# Altium schematic symbol library jlcpcb_2025_04_inductors_extended_0402.schlib: 1396 symbols (part 6 of 8) (continued)
## SDCL1005C4N7STDFM02
designator L?  Inductance: 4.7nH
Inductor, 4.7nH, SMD 0402; Manufacturer: Sunlord; Manufacturer Part Number: SDCL1005C4N7STDFM02; Package Size: 0402; JLCPCB Basic Part: No; JLCPCB Part Number: C370227; Supplier 1: LCSC; Category: Inductors; Supplier Part Number 1: C370227; RoHS: Yes; ComponentLink1Description: Datasheet; ComponentLink1URL: https://wmsc.lcsc.com/wmsc/upload/file/pdf/v2/lcsc/2110081530_Sunlord-SDCL1005C4N7STDFM02_C370227.pdf; ComponentLink2Description: JLCPCB Part URL; ComponentLink2URL: https://jlcpcb.com/partdetail/C370227; ComponentLink3Description: LCSC Part URL; ComponentLink3URL: https://lcsc.com/product-detail/Inductors-SMD_Sunlord-Sunlord-SDCL1005C4N7STDFM02_C370227.html
footprint IND-0402 (0402 (1005M) Inductor)
pins: 1, 2

## SDCL1005C5N1STDF
designator L?  Inductance: 5.1nH
Inductor, 5.1nH, 300mΩ, 300mA, SMD 0402; Manufacturer: Sunlord; Manufacturer Part Number: SDCL1005C5N1STDF; Self-Resonant Frequency: 100MHz; Q Factor: 8@100MHz; Package Size: 0402; JLCPCB Basic Part: No; JLCPCB Part Number: C33114; Supplier 1: LCSC; Category: Inductors; Supplier Part Number 1: C33114; Rated Current: 300mA; DC Resistance: 300mΩ; RoHS: Yes; ComponentLink1Description: Datasheet; ComponentLink1URL: https://wmsc.lcsc.com/wmsc/upload/file/pdf/v2/lcsc/2310301641_Sunlord-SDCL1005C5N1STDF_C33114.pdf; ComponentLink2Description: JLCPCB Part URL; ComponentLink2URL: https://jlcpcb.com/partdetail/C33114; ComponentLink3Description: LCSC Part URL; ComponentLink3URL: https://lcsc.com/product-detail/Inductors-SMD_Sunlord-Sunlord-SDCL1005C5N1STDF_C33114.html
footprint IND-0402 (0402 (1005M) Inductor)
pins: 1, 2

## SDCL1005C5N1STDFM01
designator L?  Inductance: 5.1nH
Inductor, 5.1nH, 300mΩ, 300mA, SMD 0402; Manufacturer: Sunlord; Manufacturer Part Number: SDCL1005C5N1STDFM01; Package Size: 0402; JLCPCB Basic Part: No; JLCPCB Part Number: C279821; Supplier 1: LCSC; Category: Inductors; Supplier Part Number 1: C279821; Rated Current: 300mA; DC Resistance: 300mΩ; RoHS: Yes; ComponentLink1Description: Datasheet; ComponentLink1URL: https://wmsc.lcsc.com/wmsc/upload/file/pdf/v2/lcsc/2110081330_Sunlord-SDCL1005C5N1STDFM01_C279821.pdf; ComponentLink2Description: JLCPCB Part URL; ComponentLink2URL: https://jlcpcb.com/partdetail/C279821; ComponentLink3Description: LCSC Part URL; ComponentLink3URL: https://lcsc.com/product-detail/Inductors-SMD_Sunlord-Sunlord-SDCL1005C5N1STDFM01_C279821.html
footprint IND-0402 (0402 (1005M) Inductor)
pins: 1, 2

## SDCL1005C5N6CTDFM01
designator L?  Inductance: 5.6nH
Inductor, 5.6nH, SMD 0402; Manufacturer: Sunlord; Manufacturer Part Number: SDCL1005C5N6CTDFM01; Package Size: 0402; JLCPCB Basic Part: No; JLCPCB Part Number: C370228; Supplier 1: LCSC; Category: Inductors; Supplier Part Number 1: C370228; RoHS: Yes; ComponentLink1Description: Datasheet; ComponentLink1URL: https://wmsc.lcsc.com/wmsc/upload/file/pdf/v2/lcsc/2110081530_Sunlord-SDCL1005C5N6CTDFM01_C370228.pdf; ComponentLink2Description: JLCPCB Part URL; ComponentLink2URL: https://jlcpcb.com/partdetail/C370228; ComponentLink3Description: LCSC Part URL; ComponentLink3URL: https://lcsc.com/product-detail/Inductors-SMD_Sunlord-Sunlord-SDCL1005C5N6CTDFM01_C370228.html
footprint IND-0402 (0402 (1005M) Inductor)
pins: 1, 2

## SDCL1005C5N6STDF
designator L?  Inductance: 5.6nH
Inductor, 5.6nH, 300mΩ, 300mA, SMD 0402; Manufacturer: Sunlord; Manufacturer Part Number: SDCL1005C5N6STDF; Self-Resonant Frequency: 100MHz; Q Factor: 8@100MHz; Package Size: 0402; JLCPCB Basic Part: No; JLCPCB Part Number: C279520; Supplier 1: LCSC; Category: Inductors; Supplier Part Number 1: C279520; Rated Current: 300mA; DC Resistance: 300mΩ; RoHS: Yes; ComponentLink1Description: Datasheet; ComponentLink1URL: https://wmsc.lcsc.com/wmsc/upload/file/pdf/v2/lcsc/2310301641_Sunlord-SDCL1005C5N6STDF_C279520.pdf; ComponentLink2Description: JLCPCB Part URL; ComponentLink2URL: https://jlcpcb.com/partdetail/C279520; ComponentLink3Description: LCSC Part URL; ComponentLink3URL: https://lcsc.com/product-detail/Inductors-SMD_Sunlord-Sunlord-SDCL1005C5N6STDF_C279520.html
footprint IND-0402 (0402 (1005M) Inductor)
pins: 1, 2

## SDCL1005C5N6STDFM01
designator L?  Inductance: 5.6nH
Inductor, 5.6nH, 300mΩ, 300mA, SMD 0402; Manufacturer: Sunlord; Manufacturer Part Number: SDCL1005C5N6STDFM01; Package Size: 0402; JLCPCB Basic Part: No; JLCPCB Part Number: C279773; Supplier 1: LCSC; Category: Inductors; Supplier Part Number 1: C279773; Rated Current: 300mA; DC Resistance: 300mΩ; RoHS: Yes; ComponentLink1Description: Datasheet; ComponentLink1URL: https://wmsc.lcsc.com/wmsc/upload/file/pdf/v2/lcsc/2110081330_Sunlord-SDCL1005C5N6STDFM01_C279773.pdf; ComponentLink2Description: JLCPCB Part URL; ComponentLink2URL: https://jlcpcb.com/partdetail/C279773; ComponentLink3Description: LCSC Part URL; ComponentLink3URL: https://lcsc.com/product-detail/Inductors-SMD_Sunlord-Sunlord-SDCL1005C5N6STDFM01_C279773.html
footprint IND-0402 (0402 (1005M) Inductor)
pins: 1, 2

## SDCL1005C6N2STDF
designator L?  Inductance: 6.2nH
Inductor, 6.2nH, 300mΩ, 300mA, SMD 0402; Manufacturer: Sunlord; Manufacturer Part Number: SDCL1005C6N2STDF; Self-Resonant Frequency: 100MHz; Q Factor: 8@100MHz; Package Size: 0402; JLCPCB Basic Part: No; JLCPCB Part Number: C279519; Supplier 1: LCSC; Category: Inductors; Supplier Part Number 1: C279519; Rated Current: 300mA; DC Resistance: 300mΩ; RoHS: Yes; ComponentLink1Description: Datasheet; ComponentLink1URL: https://wmsc.lcsc.com/wmsc/upload/file/pdf/v2/lcsc/2310301641_Sunlord-SDCL1005C6N2STDF_C279519.pdf; ComponentLink2Description: JLCPCB Part URL; ComponentLink2URL: https://jlcpcb.com/partdetail/C279519; ComponentLink3Description: LCSC Part URL; ComponentLink3URL: https://lcsc.com/product-detail/Inductors-SMD_Sunlord-Sunlord-SDCL1005C6N2STDF_C279519.html
footprint IND-0402 (0402 (1005M) Inductor)
pins: 1, 2

## SDCL1005C6N2STDFM01
designator L?  Inductance: 6.2nH
Inductor, 6.2nH, 300mΩ, 300mA, SMD 0402; Manufacturer: Sunlord; Manufacturer Part Number: SDCL1005C6N2STDFM01; Package Size: 0402; JLCPCB Basic Part: No; JLCPCB Part Number: C370229; Supplier 1: LCSC; Category: Inductors; Supplier Part Number 1: C370229; Rated Current: 300mA; DC Resistance: 300mΩ; RoHS: Yes; ComponentLink1Description: Datasheet; ComponentLink1URL: https://wmsc.lcsc.com/wmsc/upload/file/pdf/v2/lcsc/2110081530_Sunlord-SDCL1005C6N2STDFM01_C370229.pdf; ComponentLink2Description: JLCPCB Part URL; ComponentLink2URL: https://jlcpcb.com/partdetail/C370229; ComponentLink3Description: LCSC Part URL; ComponentLink3URL: https://lcsc.com/product-detail/Inductors-SMD_Sunlord-Sunlord-SDCL1005C6N2STDFM01_C370229.html
footprint IND-0402 (0402 (1005M) Inductor)
pins: 1, 2

## SDCL1005C6N8HTDF
designator L?  Inductance: 6.8nH
Inductor, 6.8nH, ±3%, 300mΩ, 300mA, SMD 0402; Manufacturer: Sunlord; Manufacturer Part Number: SDCL1005C6N8HTDF; Self-Resonant Frequency: 100MHz; Q Factor: 8@100MHz; Package Size: 0402; JLCPCB Basic Part: No; JLCPCB Part Number: C370230; Supplier 1: LCSC; Category: Inductors; Supplier Part Number 1: C370230; Tolerance: ±3%; Rated Current: 300mA; DC Resistance: 300mΩ; RoHS: Yes; ComponentLink1Description: Datasheet; ComponentLink1URL: https://wmsc.lcsc.com/wmsc/upload/file/pdf/v2/lcsc/2310301641_Sunlord-SDCL1005C6N8HTDF_C370230.pdf; ComponentLink2Description: JLCPCB Part URL; ComponentLink2URL: https://jlcpcb.com/partdetail/C370230; ComponentLink3Description: LCSC Part URL; ComponentLink3URL: https://lcsc.com/product-detail/Inductors-SMD_Sunlord-Sunlord-SDCL1005C6N8HTDF_C370230.html
footprint IND-0402 (0402 (1005M) Inductor)
pins: 1, 2

## SDCL1005C6N8JTDF
designator L?  Inductance: 6.8nH
Inductor, 6.8nH, ±5%, 300mΩ, 300mA, SMD 0402; Manufacturer: Sunlord; Manufacturer Part Number: SDCL1005C6N8JTDF; Q Factor: 8@100MHz; Package Size: 0402; JLCPCB Basic Part: No; JLCPCB Part Number: C32041; Supplier 1: LCSC; Category: Inductors; Supplier Part Number 1: C32041; Tolerance: ±5%; Rated Current: 300mA; DC Resistance: 300mΩ; RoHS: Yes; ComponentLink1Description: Datasheet; ComponentLink1URL: https://wmsc.lcsc.com/wmsc/upload/file/pdf/v2/lcsc/2310301641_Sunlord-SDCL1005C6N8JTDF_C32041.pdf; ComponentLink2Description: JLCPCB Part URL; ComponentLink2URL: https://jlcpcb.com/partdetail/C32041; ComponentLink3Description: LCSC Part URL; ComponentLink3URL: https://lcsc.com/product-detail/Inductors-SMD_Sunlord-Sunlord-SDCL1005C6N8JTDF_C32041.html
footprint IND-0402 (0402 (1005M) Inductor)
pins: 1, 2

## SDCL1005C6N8JTDFM01
designator L?  Inductance: 6.8nH
Inductor, 6.8nH, ±5%, 300mΩ, 300mA, SMD 0402; Manufacturer: Sunlord; Manufacturer Part Number: SDCL1005C6N8JTDFM01; Package Size: 0402; JLCPCB Basic Part: No; JLCPCB Part Number: C279543; Supplier 1: LCSC; Category: Inductors; Supplier Part Number 1: C279543; Tolerance: ±5%; Rated Current: 300mA; DC Resistance: 300mΩ; RoHS: Yes; ComponentLink1Description: Datasheet; ComponentLink1URL: https://wmsc.lcsc.com/wmsc/upload/file/pdf/v2/lcsc/2110081330_Sunlord-SDCL1005C6N8JTDFM01_C279543.pdf; ComponentLink2Description: JLCPCB Part URL; ComponentLink2URL: https://jlcpcb.com/partdetail/C279543; ComponentLink3Description: LCSC Part URL; ComponentLink3URL: https://lcsc.com/product-detail/Inductors-SMD_Sunlord-Sunlord-SDCL1005C6N8JTDFM01_C279543.html
footprint IND-0402 (0402 (1005M) Inductor)
pins: 1, 2

## SDCL1005C6N8JTDFM02
designator L?  Inductance: 6.8nH
Inductor, 6.8nH, ±5%, SMD 0402; Manufacturer: Sunlord; Manufacturer Part Number: SDCL1005C6N8JTDFM02; Package Size: 0402; JLCPCB Basic Part: No; JLCPCB Part Number: C370231; Supplier 1: LCSC; Category: Inductors; Supplier Part Number 1: C370231; Tolerance: ±5%; RoHS: Yes; ComponentLink1Description: Datasheet; ComponentLink1URL: https://wmsc.lcsc.com/wmsc/upload/file/pdf/v2/lcsc/2110081530_Sunlord-SDCL1005C6N8JTDFM02_C370231.pdf; ComponentLink2Description: JLCPCB Part URL; ComponentLink2URL: https://jlcpcb.com/partdetail/C370231; ComponentLink3Description: LCSC Part URL; ComponentLink3URL: https://lcsc.com/product-detail/Inductors-SMD_Sunlord-Sunlord-SDCL1005C6N8JTDFM02_C370231.html
footprint IND-0402 (0402 (1005M) Inductor)
pins: 1, 2

## SDCL1005C7N5JTDF
designator L?  Inductance: 7.5nH
Inductor, 7.5nH, ±5%, 400mΩ, 300mA, SMD 0402; Manufacturer: Sunlord; Manufacturer Part Number: SDCL1005C7N5JTDF; Self-Resonant Frequency: 100MHz; Q Factor: 8@100MHz; Package Size: 0402; JLCPCB Basic Part: No; JLCPCB Part Number: C279523; Supplier 1: LCSC; Category: Inductors; Supplier Part Number 1: C279523; Tolerance: ±5%; Rated Current: 300mA; DC Resistance: 400mΩ; RoHS: Yes; ComponentLink1Description: Datasheet; ComponentLink1URL: https://wmsc.lcsc.com/wmsc/upload/file/pdf/v2/lcsc/2310301641_Sunlord-SDCL1005C7N5JTDF_C279523.pdf; ComponentLink2Description: JLCPCB Part URL; ComponentLink2URL: https://jlcpcb.com/partdetail/C279523; ComponentLink3Description: LCSC Part URL; ComponentLink3URL: https://lcsc.com/product-detail/Inductors-SMD_Sunlord-Sunlord-SDCL1005C7N5JTDF_C279523.html
footprint IND-0402 (0402 (1005M) Inductor)
pins: 1, 2

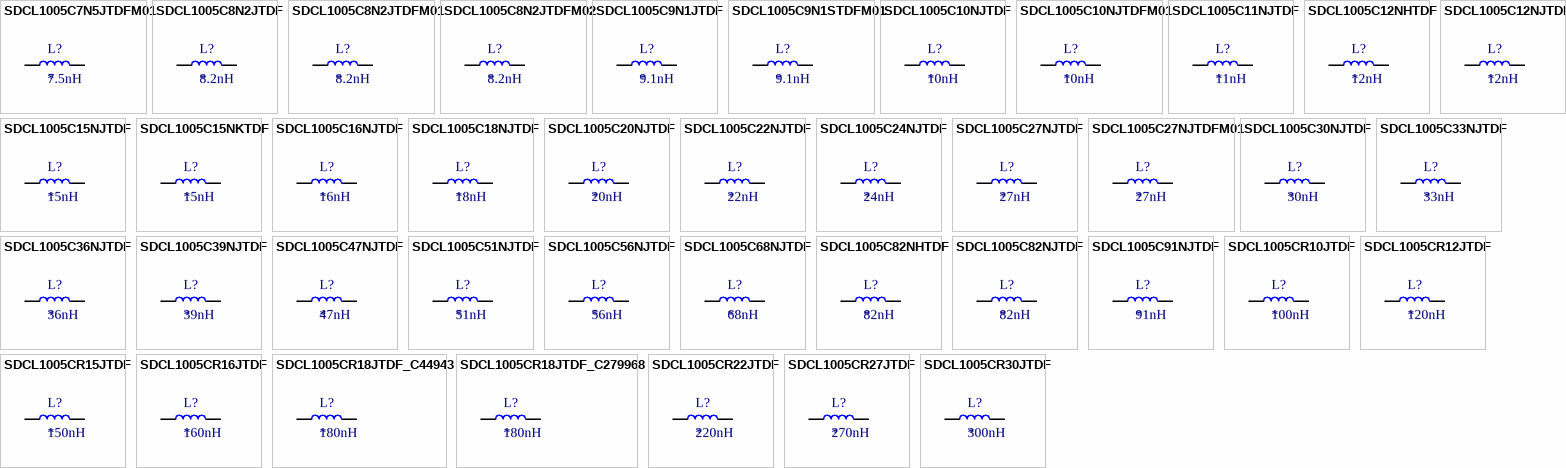
[diagram p28: symbols SDCL1005C7N5JTDFM01 to SDCL1005CR30JTDF]

## SDCL1005C7N5JTDFM01
designator L?  Inductance: 7.5nH
Inductor, 7.5nH, ±5%, 400mΩ, 300mA, SMD 0402; Manufacturer: Sunlord; Manufacturer Part Number: SDCL1005C7N5JTDFM01; Package Size: 0402; JLCPCB Basic Part: No; JLCPCB Part Number: C74295; Supplier 1: LCSC; Category: Inductors; Supplier Part Number 1: C74295; Tolerance: ±5%; Rated Current: 300mA; DC Resistance: 400mΩ; RoHS: Yes; ComponentLink1Description: Datasheet; ComponentLink1URL: https://wmsc.lcsc.com/wmsc/upload/file/pdf/v2/lcsc/2110081230_Sunlord-SDCL1005C7N5JTDFM01_C74295.pdf; ComponentLink2Description: JLCPCB Part URL; ComponentLink2URL: https://jlcpcb.com/partdetail/C74295; ComponentLink3Description: LCSC Part URL; ComponentLink3URL: https://lcsc.com/product-detail/Inductors-SMD_Sunlord-Sunlord-SDCL1005C7N5JTDFM01_C74295.html
footprint IND-0402 (0402 (1005M) Inductor)
pins: 1, 2

## SDCL1005C8N2JTDF
designator L?  Inductance: 8.2nH
Inductor, 8.2nH, ±5%, 400mΩ, 300mA, SMD 0402; Manufacturer: Sunlord; Manufacturer Part Number: SDCL1005C8N2JTDF; Self-Resonant Frequency: 100MHz; Q Factor: 8@100MHz; Package Size: 0402; JLCPCB Basic Part: No; JLCPCB Part Number: C16208; Supplier 1: LCSC; Category: Inductors; Supplier Part Number 1: C16208; Tolerance: ±5%; Rated Current: 300mA; DC Resistance: 400mΩ; RoHS: Yes; ComponentLink1Description: Datasheet; ComponentLink1URL: https://wmsc.lcsc.com/wmsc/upload/file/pdf/v2/lcsc/2310301641_Sunlord-SDCL1005C8N2JTDF_C16208.pdf; ComponentLink2Description: JLCPCB Part URL; ComponentLink2URL: https://jlcpcb.com/partdetail/C16208; ComponentLink3Description: LCSC Part URL; ComponentLink3URL: https://lcsc.com/product-detail/Inductors-SMD_Sunlord-Sunlord-SDCL1005C8N2JTDF_C16208.html
footprint IND-0402 (0402 (1005M) Inductor)
pins: 1, 2

## SDCL1005C8N2JTDFM01
designator L?  Inductance: 8.2nH
Inductor, 8.2nH, ±5%, 400mΩ, 300mA, SMD 0402; Manufacturer: Sunlord; Manufacturer Part Number: SDCL1005C8N2JTDFM01; Package Size: 0402; JLCPCB Basic Part: No; JLCPCB Part Number: C370232; Supplier 1: LCSC; Category: Inductors; Supplier Part Number 1: C370232; Tolerance: ±5%; Rated Current: 300mA; DC Resistance: 400mΩ; RoHS: Yes; ComponentLink1Description: Datasheet; ComponentLink1URL: https://wmsc.lcsc.com/wmsc/upload/file/pdf/v2/lcsc/2110081530_Sunlord-SDCL1005C8N2JTDFM01_C370232.pdf; ComponentLink2Description: JLCPCB Part URL; ComponentLink2URL: https://jlcpcb.com/partdetail/C370232; ComponentLink3Description: LCSC Part URL; ComponentLink3URL: https://lcsc.com/product-detail/Inductors-SMD_Sunlord-Sunlord-SDCL1005C8N2JTDFM01_C370232.html
footprint IND-0402 (0402 (1005M) Inductor)
pins: 1, 2

## SDCL1005C8N2JTDFM02
designator L?  Inductance: 8.2nH
Inductor, 8.2nH, ±5%, SMD 0402; Manufacturer: Sunlord; Manufacturer Part Number: SDCL1005C8N2JTDFM02; Package Size: 0402; JLCPCB Basic Part: No; JLCPCB Part Number: C370233; Supplier 1: LCSC; Category: Inductors; Supplier Part Number 1: C370233; Tolerance: ±5%; RoHS: Yes; ComponentLink1Description: Datasheet; ComponentLink1URL: https://wmsc.lcsc.com/wmsc/upload/file/pdf/v2/lcsc/2110081530_Sunlord-SDCL1005C8N2JTDFM02_C370233.pdf; ComponentLink2Description: JLCPCB Part URL; ComponentLink2URL: https://jlcpcb.com/partdetail/C370233; ComponentLink3Description: LCSC Part URL; ComponentLink3URL: https://lcsc.com/product-detail/Inductors-SMD_Sunlord-Sunlord-SDCL1005C8N2JTDFM02_C370233.html
footprint IND-0402 (0402 (1005M) Inductor)
pins: 1, 2

## SDCL1005C9N1JTDF
designator L?  Inductance: 9.1nH
Inductor, 9.1nH, ±5%, 400mΩ, 300mA, SMD 0402; Manufacturer: Sunlord; Manufacturer Part Number: SDCL1005C9N1JTDF; Q Factor: 8@100MHz; Package Size: 0402; JLCPCB Basic Part: No; JLCPCB Part Number: C279975; Supplier 1: LCSC; Category: Inductors; Supplier Part Number 1: C279975; Tolerance: ±5%; Rated Current: 300mA; DC Resistance: 400mΩ; RoHS: Yes; ComponentLink1Description: Datasheet; ComponentLink1URL: https://wmsc.lcsc.com/wmsc/upload/file/pdf/v2/lcsc/2310301641_Sunlord-SDCL1005C9N1JTDF_C279975.pdf; ComponentLink2Description: JLCPCB Part URL; ComponentLink2URL: https://jlcpcb.com/partdetail/C279975; ComponentLink3Description: LCSC Part URL; ComponentLink3URL: https://lcsc.com/product-detail/Inductors-SMD_Sunlord-Sunlord-SDCL1005C9N1JTDF_C279975.html
footprint IND-0402 (0402 (1005M) Inductor)
pins: 1, 2

## SDCL1005C9N1STDFM01
designator L?  Inductance: 9.1nH
Inductor, 9.1nH, 400mΩ, 300mA, SMD 0402; Manufacturer: Sunlord; Manufacturer Part Number: SDCL1005C9N1STDFM01; Package Size: 0402; JLCPCB Basic Part: No; JLCPCB Part Number: C74297; Supplier 1: LCSC; Category: Inductors; Supplier Part Number 1: C74297; Rated Current: 300mA; DC Resistance: 400mΩ; RoHS: Yes; ComponentLink1Description: Datasheet; ComponentLink1URL: https://wmsc.lcsc.com/wmsc/upload/file/pdf/v2/lcsc/2110081230_Sunlord-SDCL1005C9N1STDFM01_C74297.pdf; ComponentLink2Description: JLCPCB Part URL; ComponentLink2URL: https://jlcpcb.com/partdetail/C74297; ComponentLink3Description: LCSC Part URL; ComponentLink3URL: https://lcsc.com/product-detail/Inductors-SMD_Sunlord-Sunlord-SDCL1005C9N1STDFM01_C74297.html
footprint IND-0402 (0402 (1005M) Inductor)
pins: 1, 2

## SDCL1005C10NJTDF
designator L?  Inductance: 10nH
Inductor, 10nH, ±5%, 400mΩ, 300mA, SMD 0402; Manufacturer: Sunlord; Manufacturer Part Number: SDCL1005C10NJTDF; Self-Resonant Frequency: 100MHz; Q Factor: 8@100MHz; Package Size: 0402; JLCPCB Basic Part: No; JLCPCB Part Number: C27147; Supplier 1: LCSC; Category: Inductors; Supplier Part Number 1: C27147; Tolerance: ±5%; Rated Current: 300mA; DC Resistance: 400mΩ; RoHS: Yes; ComponentLink1Description: Datasheet; ComponentLink1URL: https://wmsc.lcsc.com/wmsc/upload/file/pdf/v2/lcsc/2310301641_Sunlord-SDCL1005C10NJTDF_C27147.pdf; ComponentLink2Description: JLCPCB Part URL; ComponentLink2URL: https://jlcpcb.com/partdetail/C27147; ComponentLink3Description: LCSC Part URL; ComponentLink3URL: https://lcsc.com/product-detail/Inductors-SMD_Sunlord-Sunlord-SDCL1005C10NJTDF_C27147.html
footprint IND-0402 (0402 (1005M) Inductor)
pins: 1, 2

## SDCL1005C10NJTDFM01
designator L?  Inductance: 10nH
Inductor, 10nH, ±5%, 400mΩ, 300mA, SMD 0402; Manufacturer: Sunlord; Manufacturer Part Number: SDCL1005C10NJTDFM01; Package Size: 0402; JLCPCB Basic Part: No; JLCPCB Part Number: C279838; Supplier 1: LCSC; Category: Inductors; Supplier Part Number 1: C279838; Tolerance: ±5%; Rated Current: 300mA; DC Resistance: 400mΩ; RoHS: Yes; ComponentLink1Description: Datasheet; ComponentLink1URL: https://wmsc.lcsc.com/wmsc/upload/file/pdf/v2/lcsc/2110081330_Sunlord-SDCL1005C10NJTDFM01_C279838.pdf; ComponentLink2Description: JLCPCB Part URL; ComponentLink2URL: https://jlcpcb.com/partdetail/C279838; ComponentLink3Description: LCSC Part URL; ComponentLink3URL: https://lcsc.com/product-detail/Inductors-SMD_Sunlord-Sunlord-SDCL1005C10NJTDFM01_C279838.html
footprint IND-0402 (0402 (1005M) Inductor)
pins: 1, 2

## SDCL1005C11NJTDF
designator L?  Inductance: 11nH
Inductor, 11nH, ±5%, SMD 0402; Manufacturer: Sunlord; Manufacturer Part Number: SDCL1005C11NJTDF; Package Size: 0402; JLCPCB Basic Part: No; JLCPCB Part Number: C74302; Supplier 1: LCSC; Category: Inductors; Supplier Part Number 1: C74302; Tolerance: ±5%; RoHS: Yes; ComponentLink1Description: Datasheet; ComponentLink1URL: https://wmsc.lcsc.com/wmsc/upload/file/pdf/v2/lcsc/2310301641_Sunlord-SDCL1005C11NJTDF_C74302.pdf; ComponentLink2Description: JLCPCB Part URL; ComponentLink2URL: https://jlcpcb.com/partdetail/C74302; ComponentLink3Description: LCSC Part URL; ComponentLink3URL: https://lcsc.com/product-detail/Inductors-SMD_Sunlord-Sunlord-SDCL1005C11NJTDF_C74302.html
footprint IND-0402 (0402 (1005M) Inductor)
pins: 1, 2

## SDCL1005C12NHTDF
designator L?  Inductance: 12nH
Inductor, 12nH, ±3%, 500mΩ, 300mA, SMD 0402; Manufacturer: Sunlord; Manufacturer Part Number: SDCL1005C12NHTDF; Self-Resonant Frequency: 2.7GHz; Q Factor: 8@100MHz; Package Size: 0402; JLCPCB Basic Part: No; JLCPCB Part Number: C2984259; Supplier 1: LCSC; Category: Inductors; Supplier Part Number 1: C2984259; Tolerance: ±3%; Rated Current: 300mA; DC Resistance: 500mΩ; RoHS: Yes; ComponentLink1Description: Datasheet; ComponentLink1URL: https://wmsc.lcsc.com/wmsc/upload/file/pdf/v2/lcsc/2203231830_Sunlord-SDCL1005C12NHTDF_C2984259.pdf; ComponentLink2Description: JLCPCB Part URL; ComponentLink2URL: https://jlcpcb.com/partdetail/C2984259; ComponentLink3Description: LCSC Part URL; ComponentLink3URL: https://lcsc.com/product-detail/Inductors-SMD_Sunlord-Sunlord-SDCL1005C12NHTDF_C2984259.html
footprint IND-0402 (0402 (1005M) Inductor)
pins: 1, 2

## SDCL1005C12NJTDF
designator L?  Inductance: 12nH
Inductor, 12nH, ±5%, 500mΩ, 300mA, SMD 0402; Manufacturer: Sunlord; Manufacturer Part Number: SDCL1005C12NJTDF; Self-Resonant Frequency: 100MHz; Q Factor: 8@100MHz; Package Size: 0402; JLCPCB Basic Part: No; JLCPCB Part Number: C24563; Supplier 1: LCSC; Category: Inductors; Supplier Part Number 1: C24563; Tolerance: ±5%; Rated Current: 300mA; DC Resistance: 500mΩ; RoHS: Yes; ComponentLink1Description: Datasheet; ComponentLink1URL: https://wmsc.lcsc.com/wmsc/upload/file/pdf/v2/lcsc/2310301641_Sunlord-SDCL1005C12NJTDF_C24563.pdf; ComponentLink2Description: JLCPCB Part URL; ComponentLink2URL: https://jlcpcb.com/partdetail/C24563; ComponentLink3Description: LCSC Part URL; ComponentLink3URL: https://lcsc.com/product-detail/Inductors-SMD_Sunlord-Sunlord-SDCL1005C12NJTDF_C24563.html
footprint IND-0402 (0402 (1005M) Inductor)
pins: 1, 2

## SDCL1005C15NJTDF
designator L?  Inductance: 15nH
Inductor, 15nH, ±5%, 500mΩ, 300mA, SMD 0402; Manufacturer: Sunlord; Manufacturer Part Number: SDCL1005C15NJTDF; Self-Resonant Frequency: 100MHz; Q Factor: 8@100MHz; Package Size: 0402; JLCPCB Basic Part: No; JLCPCB Part Number: C27143; Supplier 1: LCSC; Category: Inductors; Supplier Part Number 1: C27143; Tolerance: ±5%; Rated Current: 300mA; DC Resistance: 500mΩ; RoHS: Yes; ComponentLink1Description: Datasheet; ComponentLink1URL: https://wmsc.lcsc.com/wmsc/upload/file/pdf/v2/lcsc/2310301641_Sunlord-SDCL1005C15NJTDF_C27143.pdf; ComponentLink2Description: JLCPCB Part URL; ComponentLink2URL: https://jlcpcb.com/partdetail/C27143; ComponentLink3Description: LCSC Part URL; ComponentLink3URL: https://lcsc.com/product-detail/Inductors-SMD_Sunlord-Sunlord-SDCL1005C15NJTDF_C27143.html
footprint IND-0402 (0402 (1005M) Inductor)
pins: 1, 2

## SDCL1005C15NKTDF
designator L?  Inductance: 15nH
Inductor, 15nH, ±10%, 500mΩ, 300mA, SMD 0402; Manufacturer: Sunlord; Manufacturer Part Number: SDCL1005C15NKTDF; Package Size: 0402; JLCPCB Basic Part: No; JLCPCB Part Number: C370189; Supplier 1: LCSC; Category: Inductors; Supplier Part Number 1: C370189; Tolerance: ±10%; Rated Current: 300mA; DC Resistance: 500mΩ; RoHS: Yes; ComponentLink1Description: Datasheet; ComponentLink1URL: https://wmsc.lcsc.com/wmsc/upload/file/pdf/v2/lcsc/2310301641_Sunlord-SDCL1005C15NKTDF_C370189.pdf; ComponentLink2Description: JLCPCB Part URL; ComponentLink2URL: https://jlcpcb.com/partdetail/C370189; ComponentLink3Description: LCSC Part URL; ComponentLink3URL: https://lcsc.com/product-detail/Inductors-SMD_Sunlord-Sunlord-SDCL1005C15NKTDF_C370189.html
footprint IND-0402 (0402 (1005M) Inductor)
pins: 1, 2

## SDCL1005C16NJTDF
designator L?  Inductance: 16nH
Inductor, 16nH, ±5%, SMD 0402; Manufacturer: Sunlord; Manufacturer Part Number: SDCL1005C16NJTDF; Package Size: 0402; JLCPCB Basic Part: No; JLCPCB Part Number: C370190; Supplier 1: LCSC; Category: Inductors; Supplier Part Number 1: C370190; Tolerance: ±5%; RoHS: Yes; ComponentLink1Description: Datasheet; ComponentLink1URL: https://wmsc.lcsc.com/wmsc/upload/file/pdf/v2/lcsc/2312131129_Sunlord-SDCL1005C16NJTDF_C370190.pdf; ComponentLink2Description: JLCPCB Part URL; ComponentLink2URL: https://jlcpcb.com/partdetail/C370190; ComponentLink3Description: LCSC Part URL; ComponentLink3URL: https://lcsc.com/product-detail/Inductors-SMD_Sunlord-Sunlord-SDCL1005C16NJTDF_C370190.html
footprint IND-0402 (0402 (1005M) Inductor)
pins: 1, 2

## SDCL1005C18NJTDF
designator L?  Inductance: 18nH
Inductor, 18nH, ±5%, 600mΩ, 300mA, SMD 0402; Manufacturer: Sunlord; Manufacturer Part Number: SDCL1005C18NJTDF; Self-Resonant Frequency: 100MHz; Q Factor: 8@100MHz; Package Size: 0402; JLCPCB Basic Part: No; JLCPCB Part Number: C24562; Supplier 1: LCSC; Category: Inductors; Supplier Part Number 1: C24562; Tolerance: ±5%; Rated Current: 300mA; DC Resistance: 600mΩ; RoHS: Yes; ComponentLink1Description: Datasheet; ComponentLink1URL: https://wmsc.lcsc.com/wmsc/upload/file/pdf/v2/lcsc/2310301641_Sunlord-SDCL1005C18NJTDF_C24562.pdf; ComponentLink2Description: JLCPCB Part URL; ComponentLink2URL: https://jlcpcb.com/partdetail/C24562; ComponentLink3Description: LCSC Part URL; ComponentLink3URL: https://lcsc.com/product-detail/Inductors-SMD_Sunlord-Sunlord-SDCL1005C18NJTDF_C24562.html
footprint IND-0402 (0402 (1005M) Inductor)
pins: 1, 2

## SDCL1005C20NJTDF
designator L?  Inductance: 20nH
Inductor, 20nH, ±5%, 600mΩ, 300mA, SMD 0402; Manufacturer: Sunlord; Manufacturer Part Number: SDCL1005C20NJTDF; Self-Resonant Frequency: 2GHz; Q Factor: 8@100MHz; Package Size: 0402; JLCPCB Basic Part: No; JLCPCB Part Number: C96730; Supplier 1: LCSC; Category: Inductors; Supplier Part Number 1: C96730; Tolerance: ±5%; Rated Current: 300mA; DC Resistance: 600mΩ; RoHS: Yes; ComponentLink1Description: Datasheet; ComponentLink1URL: https://wmsc.lcsc.com/wmsc/upload/file/pdf/v2/lcsc/2310301641_Sunlord-SDCL1005C20NJTDF_C96730.pdf; ComponentLink2Description: JLCPCB Part URL; ComponentLink2URL: https://jlcpcb.com/partdetail/C96730; ComponentLink3Description: LCSC Part URL; ComponentLink3URL: https://lcsc.com/product-detail/Inductors-SMD_Sunlord-Sunlord-SDCL1005C20NJTDF_C96730.html
footprint IND-0402 (0402 (1005M) Inductor)
pins: 1, 2

## SDCL1005C22NJTDF
designator L?  Inductance: 22nH
Inductor, 22nH, ±5%, 600mΩ, 300mA, SMD 0402; Manufacturer: Sunlord; Manufacturer Part Number: SDCL1005C22NJTDF; Self-Resonant Frequency: 100MHz; Q Factor: 8@100MHz; Package Size: 0402; JLCPCB Basic Part: No; JLCPCB Part Number: C15178; Supplier 1: LCSC; Category: Inductors; Supplier Part Number 1: C15178; Tolerance: ±5%; Rated Current: 300mA; DC Resistance: 600mΩ; RoHS: Yes; ComponentLink1Description: Datasheet; ComponentLink1URL: https://wmsc.lcsc.com/wmsc/upload/file/pdf/v2/lcsc/2310301641_Sunlord-SDCL1005C22NJTDF_C15178.pdf; ComponentLink2Description: JLCPCB Part URL; ComponentLink2URL: https://jlcpcb.com/partdetail/C15178; ComponentLink3Description: LCSC Part URL; ComponentLink3URL: https://lcsc.com/product-detail/Inductors-SMD_Sunlord-Sunlord-SDCL1005C22NJTDF_C15178.html
footprint IND-0402 (0402 (1005M) Inductor)
pins: 1, 2

## SDCL1005C24NJTDF
designator L?  Inductance: 24nH
Inductor, 24nH, ±5%, SMD 0402; Manufacturer: Sunlord; Manufacturer Part Number: SDCL1005C24NJTDF; Package Size: 0402; JLCPCB Basic Part: No; JLCPCB Part Number: C74301; Supplier 1: LCSC; Category: Inductors; Supplier Part Number 1: C74301; Tolerance: ±5%; RoHS: Yes; ComponentLink1Description: Datasheet; ComponentLink1URL: https://wmsc.lcsc.com/wmsc/upload/file/pdf/v2/lcsc/2310301641_Sunlord-SDCL1005C24NJTDF_C74301.pdf; ComponentLink2Description: JLCPCB Part URL; ComponentLink2URL: https://jlcpcb.com/partdetail/C74301; ComponentLink3Description: LCSC Part URL; ComponentLink3URL: https://lcsc.com/product-detail/Inductors-SMD_Sunlord-Sunlord-SDCL1005C24NJTDF_C74301.html
footprint IND-0402 (0402 (1005M) Inductor)
pins: 1, 2

## SDCL1005C27NJTDF
designator L?  Inductance: 27nH
Inductor, 27nH, ±5%, 700mΩ, 300mA, SMD 0402; Manufacturer: Sunlord; Manufacturer Part Number: SDCL1005C27NJTDF; Self-Resonant Frequency: 100MHz; Q Factor: 8@100MHz; Package Size: 0402; JLCPCB Basic Part: No; JLCPCB Part Number: C18830; Supplier 1: LCSC; Category: Inductors; Supplier Part Number 1: C18830; Tolerance: ±5%; Rated Current: 300mA; DC Resistance: 700mΩ; RoHS: Yes; ComponentLink1Description: Datasheet; ComponentLink1URL: https://wmsc.lcsc.com/wmsc/upload/file/pdf/v2/lcsc/2310301641_Sunlord-SDCL1005C27NJTDF_C18830.pdf; ComponentLink2Description: JLCPCB Part URL; ComponentLink2URL: https://jlcpcb.com/partdetail/C18830; ComponentLink3Description: LCSC Part URL; ComponentLink3URL: https://lcsc.com/product-detail/Inductors-SMD_Sunlord-Sunlord-SDCL1005C27NJTDF_C18830.html
footprint IND-0402 (0402 (1005M) Inductor)
pins: 1, 2

## SDCL1005C27NJTDFM01
designator L?  Inductance: 27nH
Inductor, 27nH, ±5%, 700mΩ, 300mA, SMD 0402; Manufacturer: Sunlord; Manufacturer Part Number: SDCL1005C27NJTDFM01; Package Size: 0402; JLCPCB Basic Part: No; JLCPCB Part Number: C279788; Supplier 1: LCSC; Category: Inductors; Supplier Part Number 1: C279788; Tolerance: ±5%; Rated Current: 300mA; DC Resistance: 700mΩ; RoHS: Yes; ComponentLink1Description: Datasheet; ComponentLink1URL: https://wmsc.lcsc.com/wmsc/upload/file/pdf/v2/lcsc/2110081330_Sunlord-SDCL1005C27NJTDFM01_C279788.pdf; ComponentLink2Description: JLCPCB Part URL; ComponentLink2URL: https://jlcpcb.com/partdetail/C279788; ComponentLink3Description: LCSC Part URL; ComponentLink3URL: https://lcsc.com/product-detail/Inductors-SMD_Sunlord-Sunlord-SDCL1005C27NJTDFM01_C279788.html
footprint IND-0402 (0402 (1005M) Inductor)
pins: 1, 2

## SDCL1005C30NJTDF
designator L?  Inductance: 30nH
Inductor, 30nH, ±5%, SMD 0402; Manufacturer: Sunlord; Manufacturer Part Number: SDCL1005C30NJTDF; Package Size: 0402; JLCPCB Basic Part: No; JLCPCB Part Number: C74298; Supplier 1: LCSC; Category: Inductors; Supplier Part Number 1: C74298; Tolerance: ±5%; RoHS: Yes; ComponentLink1Description: Datasheet; ComponentLink1URL: https://wmsc.lcsc.com/wmsc/upload/file/pdf/v2/lcsc/2310301641_Sunlord-SDCL1005C30NJTDF_C74298.pdf; ComponentLink2Description: JLCPCB Part URL; ComponentLink2URL: https://jlcpcb.com/partdetail/C74298; ComponentLink3Description: LCSC Part URL; ComponentLink3URL: https://lcsc.com/product-detail/Inductors-SMD_Sunlord-Sunlord-SDCL1005C30NJTDF_C74298.html
footprint IND-0402 (0402 (1005M) Inductor)
pins: 1, 2

## SDCL1005C33NJTDF
designator L?  Inductance: 33nH
Inductor, 33nH, ±5%, 800mΩ, 200mA, SMD 0402; Manufacturer: Sunlord; Manufacturer Part Number: SDCL1005C33NJTDF; Q Factor: 8@100MHz; Package Size: 0402; JLCPCB Basic Part: No; JLCPCB Part Number: C32837; Supplier 1: LCSC; Category: Inductors; Supplier Part Number 1: C32837; Tolerance: ±5%; Rated Current: 200mA; DC Resistance: 800mΩ; RoHS: Yes; ComponentLink1Description: Datasheet; ComponentLink1URL: https://wmsc.lcsc.com/wmsc/upload/file/pdf/v2/lcsc/2310301641_Sunlord-SDCL1005C33NJTDF_C32837.pdf; ComponentLink2Description: JLCPCB Part URL; ComponentLink2URL: https://jlcpcb.com/partdetail/C32837; ComponentLink3Description: LCSC Part URL; ComponentLink3URL: https://lcsc.com/product-detail/Inductors-SMD_Sunlord-Sunlord-SDCL1005C33NJTDF_C32837.html
footprint IND-0402 (0402 (1005M) Inductor)
pins: 1, 2

## SDCL1005C36NJTDF
designator L?  Inductance: 36nH
Inductor, 36nH, ±5%, SMD 0402; Manufacturer: Sunlord; Manufacturer Part Number: SDCL1005C36NJTDF; Package Size: 0402; JLCPCB Basic Part: No; JLCPCB Part Number: C74296; Supplier 1: LCSC; Category: Inductors; Supplier Part Number 1: C74296; Tolerance: ±5%; RoHS: Yes; ComponentLink1Description: Datasheet; ComponentLink1URL: https://wmsc.lcsc.com/wmsc/upload/file/pdf/v2/lcsc/2310301641_Sunlord-SDCL1005C36NJTDF_C74296.pdf; ComponentLink2Description: JLCPCB Part URL; ComponentLink2URL: https://jlcpcb.com/partdetail/C74296; ComponentLink3Description: LCSC Part URL; ComponentLink3URL: https://lcsc.com/product-detail/Inductors-SMD_Sunlord-Sunlord-SDCL1005C36NJTDF_C74296.html
footprint IND-0402 (0402 (1005M) Inductor)
pins: 1, 2

## SDCL1005C39NJTDF
designator L?  Inductance: 39nH
Inductor, 39nH, ±5%, 1Ω, 200mA, SMD 0402; Manufacturer: Sunlord; Manufacturer Part Number: SDCL1005C39NJTDF; Q Factor: 8@100MHz; Package Size: 0402; JLCPCB Basic Part: No; JLCPCB Part Number: C26443; Supplier 1: LCSC; Category: Inductors; Supplier Part Number 1: C26443; Tolerance: ±5%; Rated Current: 200mA; DC Resistance: 1Ω; RoHS: Yes; ComponentLink1Description: Datasheet; ComponentLink1URL: https://wmsc.lcsc.com/wmsc/upload/file/pdf/v2/lcsc/2310301641_Sunlord-SDCL1005C39NJTDF_C26443.pdf; ComponentLink2Description: JLCPCB Part URL; ComponentLink2URL: https://jlcpcb.com/partdetail/C26443; ComponentLink3Description: LCSC Part URL; ComponentLink3URL: https://lcsc.com/product-detail/Inductors-SMD_Sunlord-Sunlord-SDCL1005C39NJTDF_C26443.html
footprint IND-0402 (0402 (1005M) Inductor)
pins: 1, 2

## SDCL1005C47NJTDF
designator L?  Inductance: 47nH
Inductor, 47nH, ±5%, 1.1Ω, 200mA, SMD 0402; Manufacturer: Sunlord; Manufacturer Part Number: SDCL1005C47NJTDF; Self-Resonant Frequency: 100MHz; Q Factor: 8@100MHz; Package Size: 0402; JLCPCB Basic Part: No; JLCPCB Part Number: C27151; Supplier 1: LCSC; Category: Inductors; Supplier Part Number 1: C27151; Tolerance: ±5%; Rated Current: 200mA; DC Resistance: 1.1Ω; RoHS: Yes; ComponentLink1Description: Datasheet; ComponentLink1URL: https://wmsc.lcsc.com/wmsc/upload/file/pdf/v2/lcsc/2310301641_Sunlord-SDCL1005C47NJTDF_C27151.pdf; ComponentLink2Description: JLCPCB Part URL; ComponentLink2URL: https://jlcpcb.com/partdetail/C27151; ComponentLink3Description: LCSC Part URL; ComponentLink3URL: https://lcsc.com/product-detail/Inductors-SMD_Sunlord-Sunlord-SDCL1005C47NJTDF_C27151.html
footprint IND-0402 (0402 (1005M) Inductor)
pins: 1, 2

## SDCL1005C51NJTDF
designator L?  Inductance: 51nH
Inductor, 51nH, ±5%, SMD 0402; Manufacturer: Sunlord; Manufacturer Part Number: SDCL1005C51NJTDF; Package Size: 0402; JLCPCB Basic Part: No; JLCPCB Part Number: C18832; Supplier 1: LCSC; Category: Inductors; Supplier Part Number 1: C18832; Tolerance: ±5%; RoHS: Yes; ComponentLink1Description: Datasheet; ComponentLink1URL: https://wmsc.lcsc.com/wmsc/upload/file/pdf/v2/lcsc/2310301641_Sunlord-SDCL1005C51NJTDF_C18832.pdf; ComponentLink2Description: JLCPCB Part URL; ComponentLink2URL: https://jlcpcb.com/partdetail/C18832; ComponentLink3Description: LCSC Part URL; ComponentLink3URL: https://lcsc.com/product-detail/Inductors-SMD_Sunlord-Sunlord-SDCL1005C51NJTDF_C18832.html
footprint IND-0402 (0402 (1005M) Inductor)
pins: 1, 2

## SDCL1005C56NJTDF
designator L?  Inductance: 56nH
Inductor, 56nH, ±5%, 1.2Ω, 200mA, SMD 0402; Manufacturer: Sunlord; Manufacturer Part Number: SDCL1005C56NJTDF; Q Factor: 8@100MHz; Package Size: 0402; JLCPCB Basic Part: No; JLCPCB Part Number: C32004; Supplier 1: LCSC; Category: Inductors; Supplier Part Number 1: C32004; Tolerance: ±5%; Rated Current: 200mA; DC Resistance: 1.2Ω; RoHS: Yes; ComponentLink1Description: Datasheet; ComponentLink1URL: https://wmsc.lcsc.com/wmsc/upload/file/pdf/v2/lcsc/2310301641_Sunlord-SDCL1005C56NJTDF_C32004.pdf; ComponentLink2Description: JLCPCB Part URL; ComponentLink2URL: https://jlcpcb.com/partdetail/C32004; ComponentLink3Description: LCSC Part URL; ComponentLink3URL: https://lcsc.com/product-detail/Inductors-SMD_Sunlord-Sunlord-SDCL1005C56NJTDF_C32004.html
footprint IND-0402 (0402 (1005M) Inductor)
pins: 1, 2

## SDCL1005C68NJTDF
designator L?  Inductance: 68nH
Inductor, 68nH, ±5%, 1.4Ω, 180mA, SMD 0402; Manufacturer: Sunlord; Manufacturer Part Number: SDCL1005C68NJTDF; Q Factor: 8@100MHz; Package Size: 0402; JLCPCB Basic Part: No; JLCPCB Part Number: C32836; Supplier 1: LCSC; Category: Inductors; Supplier Part Number 1: C32836; Tolerance: ±5%; Rated Current: 180mA; DC Resistance: 1.4Ω; RoHS: Yes; ComponentLink1Description: Datasheet; ComponentLink1URL: https://wmsc.lcsc.com/wmsc/upload/file/pdf/v2/lcsc/2310301641_Sunlord-SDCL1005C68NJTDF_C32836.pdf; ComponentLink2Description: JLCPCB Part URL; ComponentLink2URL: https://jlcpcb.com/partdetail/C32836; ComponentLink3Description: LCSC Part URL; ComponentLink3URL: https://lcsc.com/product-detail/Inductors-SMD_Sunlord-Sunlord-SDCL1005C68NJTDF_C32836.html
footprint IND-0402 (0402 (1005M) Inductor)
pins: 1, 2

## SDCL1005C82NHTDF
designator L?  Inductance: 82nH
Inductor, 82nH, ±3%, 2.4Ω, 150mA, SMD 0402; Manufacturer: Sunlord; Manufacturer Part Number: SDCL1005C82NHTDF; Self-Resonant Frequency: 750MHz; Q Factor: 8@100MHz; Package Size: 0402; JLCPCB Basic Part: No; JLCPCB Part Number: C525659; Supplier 1: LCSC; Category: Inductors; Supplier Part Number 1: C525659; Tolerance: ±3%; Rated Current: 150mA; DC Resistance: 2.4Ω; RoHS: Yes; ComponentLink1Description: Datasheet; ComponentLink1URL: https://wmsc.lcsc.com/wmsc/upload/file/pdf/v2/lcsc/2310301641_Sunlord-SDCL1005C82NHTDF_C525659.pdf; ComponentLink2Description: JLCPCB Part URL; ComponentLink2URL: https://jlcpcb.com/partdetail/C525659; ComponentLink3Description: LCSC Part URL; ComponentLink3URL: https://lcsc.com/product-detail/Inductors-SMD_Sunlord-Sunlord-SDCL1005C82NHTDF_C525659.html
footprint IND-0402 (0402 (1005M) Inductor)
pins: 1, 2

## SDCL1005C82NJTDF
designator L?  Inductance: 82nH
Inductor, 82nH, ±5%, 2.4Ω, 150mA, SMD 0402; Manufacturer: Sunlord; Manufacturer Part Number: SDCL1005C82NJTDF; Q Factor: 8@100MHz; Package Size: 0402; JLCPCB Basic Part: No; JLCPCB Part Number: C49500; Supplier 1: LCSC; Category: Inductors; Supplier Part Number 1: C49500; Tolerance: ±5%; Rated Current: 150mA; DC Resistance: 2.4Ω; RoHS: Yes; ComponentLink1Description: Datasheet; ComponentLink1URL: https://wmsc.lcsc.com/wmsc/upload/file/pdf/v2/lcsc/2310301641_Sunlord-SDCL1005C82NJTDF_C49500.pdf; ComponentLink2Description: JLCPCB Part URL; ComponentLink2URL: https://jlcpcb.com/partdetail/C49500; ComponentLink3Description: LCSC Part URL; ComponentLink3URL: https://lcsc.com/product-detail/Inductors-SMD_Sunlord-Sunlord-SDCL1005C82NJTDF_C49500.html
footprint IND-0402 (0402 (1005M) Inductor)
pins: 1, 2

## SDCL1005C91NJTDF
designator L?  Inductance: 91nH
Inductor, 91nH, ±5%, SMD 0402; Manufacturer: Sunlord; Manufacturer Part Number: SDCL1005C91NJTDF; Package Size: 0402; JLCPCB Basic Part: No; JLCPCB Part Number: C279758; Supplier 1: LCSC; Category: Inductors; Supplier Part Number 1: C279758; Tolerance: ±5%; RoHS: Yes; ComponentLink1Description: Datasheet; ComponentLink1URL: https://wmsc.lcsc.com/wmsc/upload/file/pdf/v2/lcsc/2310301641_Sunlord-SDCL1005C91NJTDF_C279758.pdf; ComponentLink2Description: JLCPCB Part URL; ComponentLink2URL: https://jlcpcb.com/partdetail/C279758; ComponentLink3Description: LCSC Part URL; ComponentLink3URL: https://lcsc.com/product-detail/Inductors-SMD_Sunlord-Sunlord-SDCL1005C91NJTDF_C279758.html
footprint IND-0402 (0402 (1005M) Inductor)
pins: 1, 2

## SDCL1005CR10JTDF
designator L?  Inductance: 100nH
Inductor, 100nH, ±5%, 2.6Ω, 150mA, SMD 0402; Manufacturer: Sunlord; Manufacturer Part Number: SDCL1005CR10JTDF; Self-Resonant Frequency: 100MHz; Q Factor: 8@100MHz; Package Size: 0402; JLCPCB Basic Part: No; JLCPCB Part Number: C22726; Supplier 1: LCSC; Category: Inductors; Supplier Part Number 1: C22726; Tolerance: ±5%; Rated Current: 150mA; DC Resistance: 2.6Ω; RoHS: Yes; ComponentLink1Description: Datasheet; ComponentLink1URL: https://wmsc.lcsc.com/wmsc/upload/file/pdf/v2/lcsc/2310301641_Sunlord-SDCL1005CR10JTDF_C22726.pdf; ComponentLink2Description: JLCPCB Part URL; ComponentLink2URL: https://jlcpcb.com/partdetail/C22726; ComponentLink3Description: LCSC Part URL; ComponentLink3URL: https://lcsc.com/product-detail/Inductors-SMD_Sunlord-Sunlord-SDCL1005CR10JTDF_C22726.html
footprint IND-0402 (0402 (1005M) Inductor)
pins: 1, 2

## SDCL1005CR12JTDF
designator L?  Inductance: 120nH
Inductor, 120nH, ±5%, 2.8Ω, 150mA, SMD 0402; Manufacturer: Sunlord; Manufacturer Part Number: SDCL1005CR12JTDF; Self-Resonant Frequency: 100MHz; Q Factor: 8@100MHz; Package Size: 0402; JLCPCB Basic Part: No; JLCPCB Part Number: C27149; Supplier 1: LCSC; Category: Inductors; Supplier Part Number 1: C27149; Tolerance: ±5%; Rated Current: 150mA; DC Resistance: 2.8Ω; RoHS: Yes; ComponentLink1Description: Datasheet; ComponentLink1URL: https://wmsc.lcsc.com/wmsc/upload/file/pdf/v2/lcsc/2310301641_Sunlord-SDCL1005CR12JTDF_C27149.pdf; ComponentLink2Description: JLCPCB Part URL; ComponentLink2URL: https://jlcpcb.com/partdetail/C27149; ComponentLink3Description: LCSC Part URL; ComponentLink3URL: https://lcsc.com/product-detail/Inductors-SMD_Sunlord-Sunlord-SDCL1005CR12JTDF_C27149.html
footprint IND-0402 (0402 (1005M) Inductor)
pins: 1, 2

## SDCL1005CR15JTDF
designator L?  Inductance: 150nH
Inductor, 150nH, ±5%, 3.2Ω, 100mA, SMD 0402; Manufacturer: Sunlord; Manufacturer Part Number: SDCL1005CR15JTDF; Self-Resonant Frequency: 100MHz; Q Factor: 8@100MHz; Package Size: 0402; JLCPCB Basic Part: No; JLCPCB Part Number: C44566; Supplier 1: LCSC; Category: Inductors; Supplier Part Number 1: C44566; Tolerance: ±5%; Rated Current: 100mA; DC Resistance: 3.2Ω; RoHS: Yes; ComponentLink1Description: Datasheet; ComponentLink1URL: https://wmsc.lcsc.com/wmsc/upload/file/pdf/v2/lcsc/2310301641_Sunlord-SDCL1005CR15JTDF_C44566.pdf; ComponentLink2Description: JLCPCB Part URL; ComponentLink2URL: https://jlcpcb.com/partdetail/C44566; ComponentLink3Description: LCSC Part URL; ComponentLink3URL: https://lcsc.com/product-detail/Inductors-SMD_Sunlord-Sunlord-SDCL1005CR15JTDF_C44566.html
footprint IND-0402 (0402 (1005M) Inductor)
pins: 1, 2

## SDCL1005CR16JTDF
designator L?  Inductance: 160nH
Inductor, 160nH, ±5%, 2.6Ω, 150mA, SMD 0402; Manufacturer: Sunlord; Manufacturer Part Number: SDCL1005CR16JTDF; Package Size: 0402; JLCPCB Basic Part: No; JLCPCB Part Number: C279966; Supplier 1: LCSC; Category: Inductors; Supplier Part Number 1: C279966; Tolerance: ±5%; Rated Current: 150mA; DC Resistance: 2.6Ω; RoHS: Yes; ComponentLink1Description: Datasheet; ComponentLink1URL: https://wmsc.lcsc.com/wmsc/upload/file/pdf/v2/lcsc/2310301641_Sunlord-SDCL1005CR16JTDF_C279966.pdf; ComponentLink2Description: JLCPCB Part URL; ComponentLink2URL: https://jlcpcb.com/partdetail/C279966; ComponentLink3Description: LCSC Part URL; ComponentLink3URL: https://lcsc.com/product-detail/Inductors-SMD_Sunlord-Sunlord-SDCL1005CR16JTDF_C279966.html
footprint IND-0402 (0402 (1005M) Inductor)
pins: 1, 2

## SDCL1005CR18JTDF_C44943
designator L?  Inductance: 180nH
Inductor, 180nH, ±5%, 3.7Ω, 100mA, SMD 0402; Manufacturer: Sunlord; Manufacturer Part Number: SDCL1005CR18JTDF; Self-Resonant Frequency: 100MHz; Q Factor: 8@100MHz; Package Size: 0402; JLCPCB Basic Part: No; JLCPCB Part Number: C44943; Supplier 1: LCSC; Category: Inductors; Supplier Part Number 1: C44943; Tolerance: ±5%; Rated Current: 100mA; DC Resistance: 3.7Ω; RoHS: Yes; ComponentLink1Description: Datasheet; ComponentLink1URL: https://wmsc.lcsc.com/wmsc/upload/file/pdf/v2/lcsc/2310301641_Sunlord-SDCL1005CR18JTDF_C44943.pdf; ComponentLink2Description: JLCPCB Part URL; ComponentLink2URL: https://jlcpcb.com/partdetail/C44943; ComponentLink3Description: LCSC Part URL; ComponentLink3URL: https://lcsc.com/product-detail/Inductors-SMD_Sunlord-Sunlord-SDCL1005CR18JTDF_C44943.html
footprint IND-0402 (0402 (1005M) Inductor)
pins: 1, 2

## SDCL1005CR18JTDF_C279968
designator L?  Inductance: 180nH
Inductor, 180nH, ±5%, 3.7Ω, 100mA, SMD 0402; Manufacturer: Sunlord; Manufacturer Part Number: SDCL1005CR18JTDF; Q Factor: 8@100MHz; Package Size: 0402; JLCPCB Basic Part: No; JLCPCB Part Number: C279968; Supplier 1: LCSC; Category: Inductors; Supplier Part Number 1: C279968; Tolerance: ±5%; Rated Current: 100mA; DC Resistance: 3.7Ω; RoHS: Yes; ComponentLink1Description: Datasheet; ComponentLink1URL: https://wmsc.lcsc.com/wmsc/upload/file/pdf/v2/lcsc/2310301641_Sunlord-SDCL1005CR18JTDF_C279968.pdf; ComponentLink2Description: JLCPCB Part URL; ComponentLink2URL: https://jlcpcb.com/partdetail/C279968; ComponentLink3Description: LCSC Part URL; ComponentLink3URL: https://lcsc.com/product-detail/Inductors-SMD_Sunlord-Sunlord-SDCL1005CR18JTDF_C279968.html
footprint IND-0402 (0402 (1005M) Inductor)
pins: 1, 2

## SDCL1005CR22JTDF
designator L?  Inductance: 220nH
Inductor, 220nH, ±5%, 4Ω, 100mA, SMD 0402; Manufacturer: Sunlord; Manufacturer Part Number: SDCL1005CR22JTDF; Self-Resonant Frequency: 100MHz; Q Factor: 8@100MHz; Package Size: 0402; JLCPCB Basic Part: No; JLCPCB Part Number: C18834; Supplier 1: LCSC; Category: Inductors; Supplier Part Number 1: C18834; Tolerance: ±5%; Rated Current: 100mA; DC Resistance: 4Ω; RoHS: Yes; ComponentLink1Description: Datasheet; ComponentLink1URL: https://wmsc.lcsc.com/wmsc/upload/file/pdf/v2/lcsc/2310301641_Sunlord-SDCL1005CR22JTDF_C18834.pdf; ComponentLink2Description: JLCPCB Part URL; ComponentLink2URL: https://jlcpcb.com/partdetail/C18834; ComponentLink3Description: LCSC Part URL; ComponentLink3URL: https://lcsc.com/product-detail/Inductors-SMD_Sunlord-Sunlord-SDCL1005CR22JTDF_C18834.html
footprint IND-0402 (0402 (1005M) Inductor)
pins: 1, 2

## SDCL1005CR27JTDF
designator L?  Inductance: 270nH
Inductor, 270nH, ±5%, 4.5Ω, 100mA, SMD 0402; Manufacturer: Sunlord; Manufacturer Part Number: SDCL1005CR27JTDF; Self-Resonant Frequency: 100MHz; Q Factor: 8@100MHz; Package Size: 0402; JLCPCB Basic Part: No; JLCPCB Part Number: C49501; Supplier 1: LCSC; Category: Inductors; Supplier Part Number 1: C49501; Tolerance: ±5%; Rated Current: 100mA; DC Resistance: 4.5Ω; RoHS: Yes; ComponentLink1Description: Datasheet; ComponentLink1URL: https://wmsc.lcsc.com/wmsc/upload/file/pdf/v2/lcsc/2310301641_Sunlord-SDCL1005CR27JTDF_C49501.pdf; ComponentLink2Description: JLCPCB Part URL; ComponentLink2URL: https://jlcpcb.com/partdetail/C49501; ComponentLink3Description: LCSC Part URL; ComponentLink3URL: https://lcsc.com/product-detail/Inductors-SMD_Sunlord-Sunlord-SDCL1005CR27JTDF_C49501.html
footprint IND-0402 (0402 (1005M) Inductor)
pins: 1, 2

## SDCL1005CR30JTDF
designator L?  Inductance: 300nH
Inductor, 300nH, ±5%, 4.5Ω, 100mA, SMD 0402; Manufacturer: Sunlord; Manufacturer Part Number: SDCL1005CR30JTDF; Package Size: 0402; JLCPCB Basic Part: No; JLCPCB Part Number: C316415; Supplier 1: LCSC; Category: Inductors; Supplier Part Number 1: C316415; Tolerance: ±5%; Rated Current: 100mA; DC Resistance: 4.5Ω; RoHS: Yes; ComponentLink1Description: Datasheet; ComponentLink1URL: https://wmsc.lcsc.com/wmsc/upload/file/pdf/v2/lcsc/2310301641_Sunlord-SDCL1005CR30JTDF_C316415.pdf; ComponentLink2Description: JLCPCB Part URL; ComponentLink2URL: https://jlcpcb.com/partdetail/C316415; ComponentLink3Description: LCSC Part URL; ComponentLink3URL: https://lcsc.com/product-detail/Inductors-SMD_Sunlord-Sunlord-SDCL1005CR30JTDF_C316415.html
footprint IND-0402 (0402 (1005M) Inductor)
pins: 1, 2

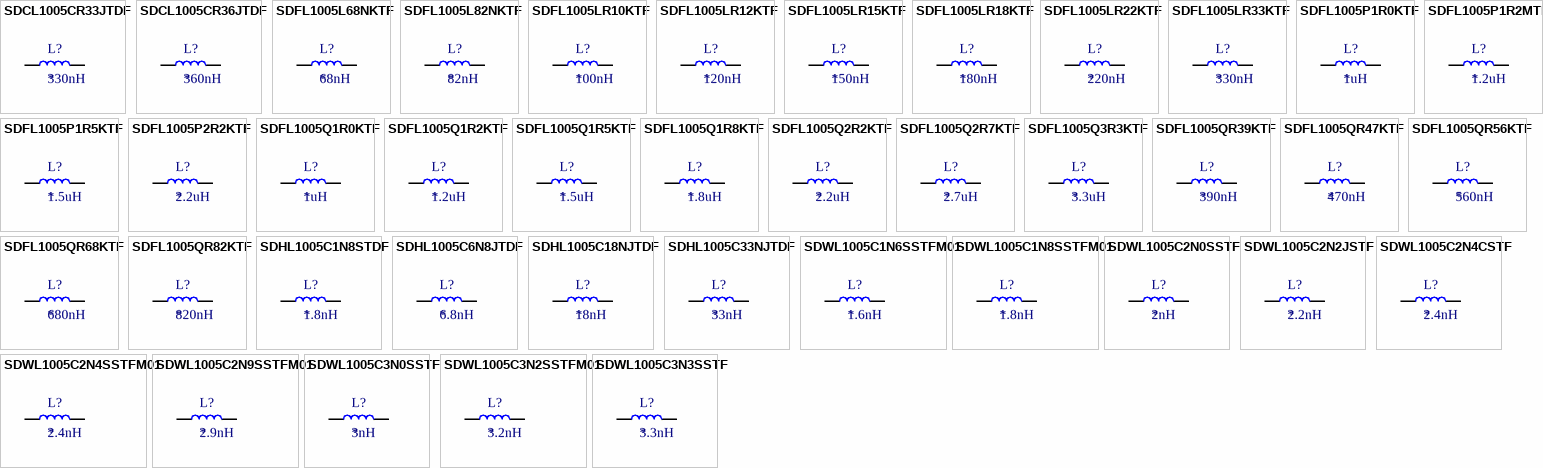
[diagram p29: symbols SDCL1005CR33JTDF to SDWL1005C3N3SSTF]